# Altium footprint library Connectors.PcbLib: 36 footprints (part 2 of 3)
Each footprint in its own frame and in the unit in brackets; x right, y up, seen from the top. Pads: shape width x height; smd on the part's side, far side on the other; paste and mask are expansions set on the pad; w line width, h text height; cw(c..) or ccw(c..) is an arc to the next point about the centre after c.
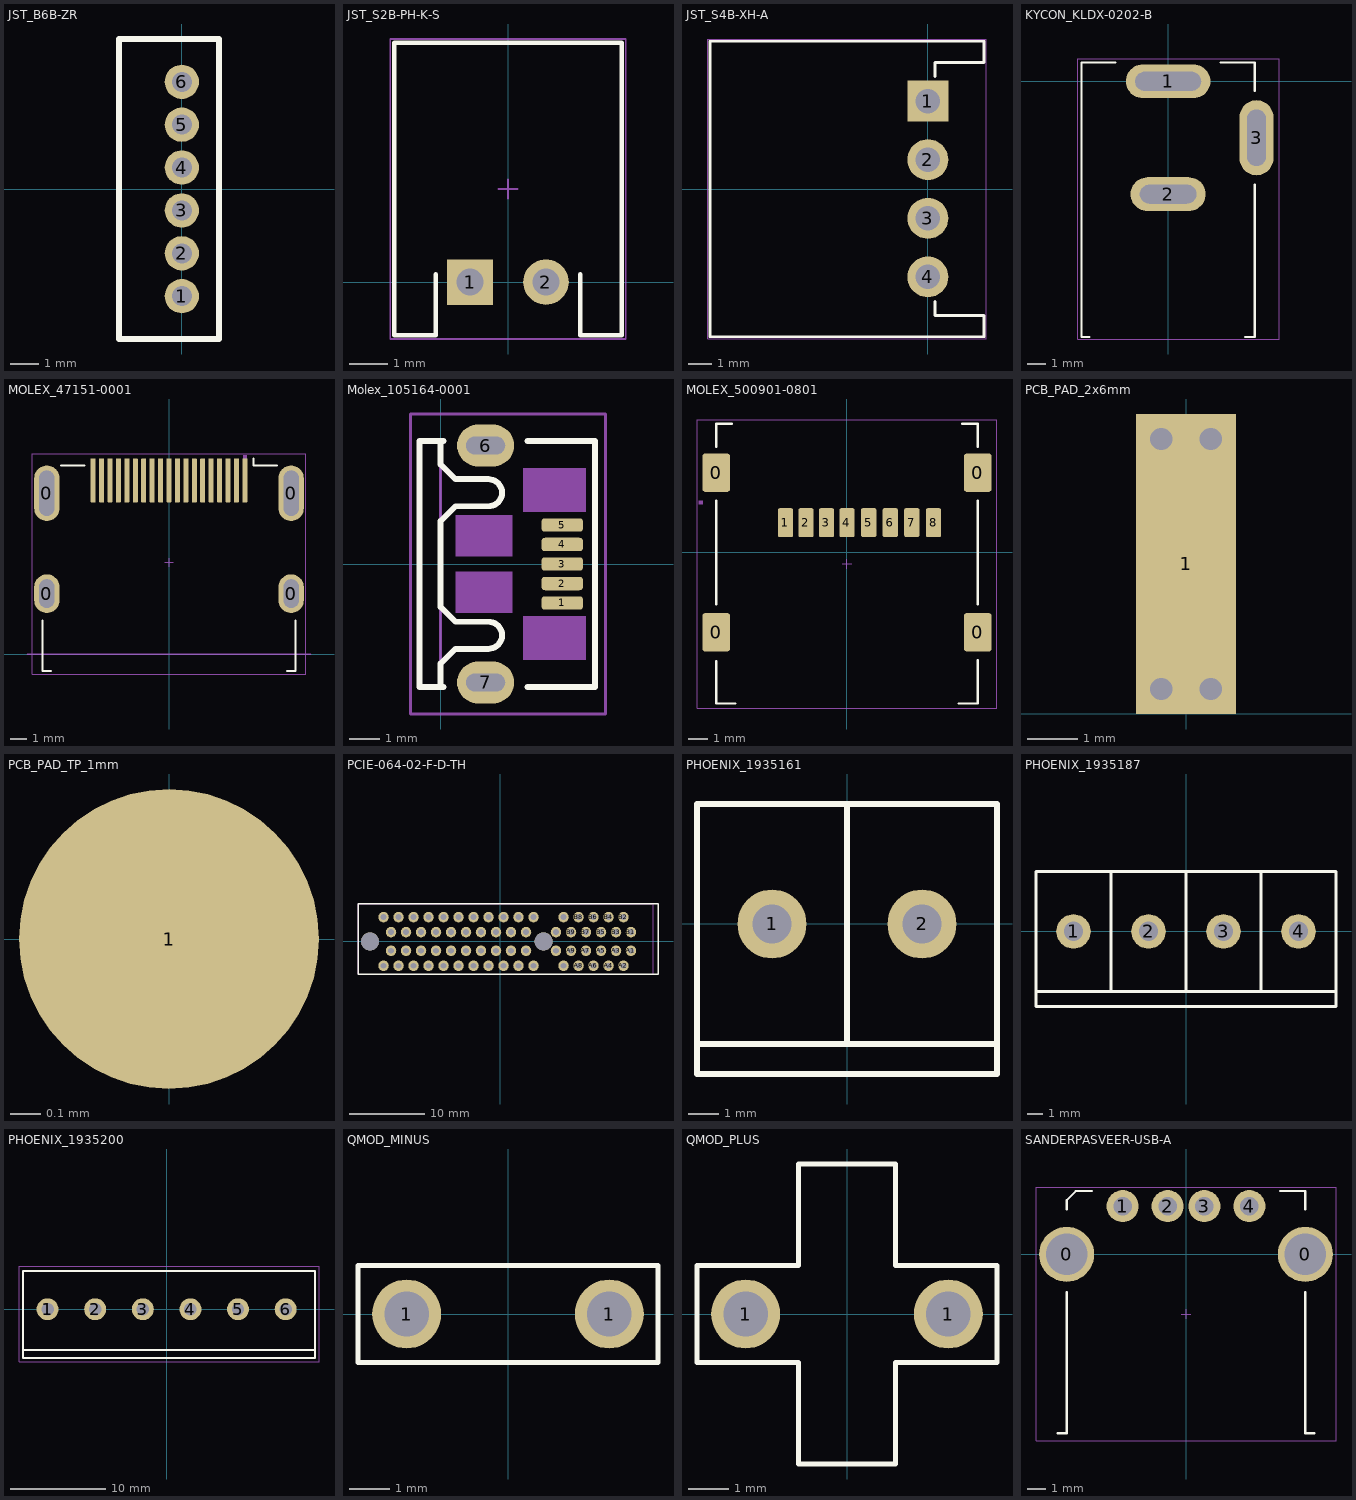
[diagram p1: the footprints below, top view; thin cyan lines are the x and y axes]

## JST_B6B-ZR [mm] "1.5mm pitch/Disconnectable Crimp style connector"
height 4.5
pads (6):
  round 1.2 hole 0.7: 1(0,-3.75) 2(0,-2.25) 3(0,-0.75) 4(0,0.75) 5(0,2.25) 6(0,3.75)
Top Overlay:
  lines w0.2: -2.2,-5.25 -2.2,5.25 1.3,5.25 1.3,-5.25 -2.2,-5.25
15. Courtyard TOP:
  lines w0.1: -2.2,-5.25 1.3,-5.25 1.3,5.25 -2.2,5.25 -2.2,-5.25
  text "." at 0.7,-4.85 h1
  text ".designator" at 0.5,-2.75 h1.5

## JST_S2B-PH-K-S [mm]
height 4.8
pads (2):
  rect 1.2x1.2 hole 0.7: 1(-1,0)
  round 1.2 hole 0.7: 2(1,0)
Top Overlay:
  lines w0.12: -1.9,0.2 -1.9,-1.4 -3,-1.4 -3,6.3 3,6.3 3,-1.4 1.9,-1.4 1.9,0.2
15. Courtyard TOP:
  lines w0.05: -0.25,2.45 0.25,2.45 ; 0,2.2 0,2.7 ; -3.1,-1.5 -3.1,6.4 3.1,6.4 3.1,-1.5 -3.1,-1.5
18. Assembly TOP:
  lines w0.05: -3.1,-1.5 3.1,-1.5 3.1,6.4 -3.1,6.4 -3.1,-1.5
  text ".designator" at 0.6,-0.3 h1.5
3D body: height 4.81, standoff -3.39, extent -2.95,-1.35 2.95,6.25

## JST_S4B-XH-A [mm]
height 6
pads (4):
  rect 1.75x1.75 hole 1.05: 1(0,3.75)
  round 1.75 hole 1.05: 2(0,1.25) 3(0,-1.25) 4(0,-3.75)
Top Overlay:
  lines w0.12: 0.3,-4.8 0.3,-5.4 2.4,-5.4 2.4,-6.3 -9.3,-6.3 -9.3,6.3 2.4,6.3 2.4,5.4 0.3,5.4 0.3,4.8
15. Courtyard TOP:
  lines w0.05: -9.4,-6.4 2.5,-6.4 2.5,6.4 -9.4,6.4 -9.4,-6.4
  text ".designator" at -8.3,-0.6 h1.5
3D body: height 6.11, standoff -3.39, extent -9.2,-6.2 2.3,6.2

## KYCON_KLDX-0202-B [mm] "Kycon DC Power Connectors 2.5mm PCB"
height 11
pads (3):
  oval 4.5x1.8 hole 1 slot 3.5 at 0 deg: 1(0,0)
  oval 4x1.8 hole 1 slot 3 at 0 deg: 2(0,-6)
  oval 1.8x4 hole 1 slot 3 at 90 deg: 3(4.7,-3)
Top Overlay:
  lines w0.12: -4.2,-13.6 -4.6,-13.6 -4.6,1 -2.794,1 ; 2.794,1 4.6,1 4.6,-0.508 ; 4.1,-13.6 4.6,-13.6 4.6,-5.5
15. Courtyard TOP:
  lines w0.05: 0.3,-6.25 0.8,-6.25 ; 0.55,-6.5 0.55,-6 ; -4.8,-13.7 5.9,-13.7 5.9,1.2 -4.8,1.2 -4.8,-13.7
18. Assembly TOP:
  lines w0.05: -4.8,-13.7 5.9,-13.7 5.9,1.2 -4.8,1.2 -4.8,-13.7
  text ".designator" at -2.6,-6.8 h1.5
3D body: height 11.18, standoff -3.6, extent -4.572,-13.539 4.9,0.939

## MOLEX_47151-0001 [mm] "Molex HDMI right angle header assembly"
height 6.2
pads (23):
  oval 1.5x2.3 hole 0.9 slot 1.7 at 90 deg mask+0.07: 0(-7.25,3.59) 0(7.25,3.59)
  oval 1.5x3.3 hole 0.9 slot 2.7 at 90 deg mask+0.07: 0(-7.25,9.55) 0(7.25,9.55)
  rrect23% 0.3x2.6 smd: 1(4.5,10.31) 2(4,10.31) 3(3.5,10.31) 4(3,10.31) 5(2.5,10.31) 6(2,10.31) 7(1.5,10.31) 8(1,10.31) 9(0.5,10.31) 10(0,10.31) 11(-0.5,10.31) 12(-1,10.31) 13(-1.5,10.31) 14(-2,10.31) 15(-2.5,10.31) 16(-3,10.31) 17(-3.5,10.31) 18(-4,10.31) 19(-4.5,10.31)
Top Overlay:
  lines w0.12: -7.5,2 -7.5,-1 -7,-1 ; -6.4,11.2 -5,11.2 ; 5,11.6 5,11.2 6.4,11.2 ; 7,-1 7.5,-1 7.5,2
15. Courtyard TOP:
  lines w0.05: -0.25,5.45 0.25,5.45 ; 0,5.2 0,5.7 ; -8.1,-1.2 -8.1,11.9 8.1,11.9 8.1,-1.2 -8.1,-1.2
18. Assembly TOP:
  region: 4.4,11.8 4.6,11.8 4.6,11.6 4.4,11.6
  lines w0.05: -8.1,-1.2 8.1,-1.2 8.1,11.9 -8.1,11.9 -8.1,-1.2
  text ".designator" at -2.7,4.7 h1.5
20. Alignments:
  lines w0.1: -8.4,0 8.4,0 ; 8.4,0 8.4,0
3D body: height 6.18, standoff -2.17, extent -7.5,-0.95 7.5,11.21

## Molex_105164-0001 [mm] "Micro USB connector"
height 2.7
pads (7):
  rrect50% 1.38x0.45 smd: 1(4.058,-1.3) 2(4.058,-0.65) 3(4.058,0) 4(4.058,0.65) 5(4.058,1.3)
  oval 1.9x1.4 hole 0.6 slot 1.3 at 0 deg: 6(1.502,3.95) 7(1.502,-3.95)
Top Overlay:
  lines w0.2: 0,-4.1 0,-3.325 0.5,-2.825 1.6,-2.825 ccw(c1.6,-2.375) 2.05,-2.375 ccw(c1.6,-2.375) 1.6,-1.925 0.5,-1.925 0,-1.425 0,1.425 0.5,1.925 1.6,1.925 ccw(c1.6,2.375) 2.05,2.375 ccw(c1.6,2.375) 1.6,2.825 0.5,2.825 0,3.325 0,4.1 ; 0.1,-4.1 -0.7,-4.1 -0.7,4.1 0.1,4.1 ; 2.9,-4.1 5.142,-4.1 5.142,4.1 2.9,4.1
15. Courtyard TOP:
  lines w0.1: -1,-5 5.5,-5 5.5,5 -1,5 -1,-5
  text "." at 4,-1.4 h1
  text ".designator" at 0.8,-0.5 h1
20. Alignments:
  lines w0.1: 0,-4.1 0,4.1
21. Comp.notes:
  rectangle: 0.5,-1.625 2.4,-0.25
  rectangle: 0.5,0.25 2.4,1.625
  rectangle: 2.75,-3.2 4.85,-1.725
  rectangle: 2.75,1.725 4.85,3.2
  text "note: 3D Model incomplete" at 0,-0.1 h0.2
3D body: height 2.72, standoff -0.58, extent -0.73,-4.1 4.7,4.1

## MOLEX_500901-0801 [mm] "MicroSD hinged memory card connector"
height 2
pads (12):
  rrect23% 1.45x2 smd: 0(-6.8,-4.15) 0(-6.8,4.15) 0(6.8,-4.15) 0(6.8,4.15)
  rrect23% 0.8x1.5 smd: 1(-3.2,1.55) 2(-2.133,1.55) 3(-1.067,1.55) 4(0,1.55) 5(1.125,1.55) 6(2.25,1.55) 7(3.375,1.55) 8(4.5,1.55)
Top Overlay:
  lines w0.12: -6.8,-5.65 -6.8,-7.85 -5.8,-7.85 ; -6.8,-2.7 -6.8,2.7 ; -6.8,5.5 -6.8,6.7 -6,6.7 ; 5.8,-7.85 6.8,-7.85 6.8,-5.6 ; 6,6.7 6.8,6.7 6.8,5.5 ; 6.8,-2.7 6.8,2.7
15. Courtyard TOP:
  lines w0.05: -0.25,-0.6 0.25,-0.6 ; 0,-0.85 0,-0.35 ; -7.8,-8.1 -7.8,6.9 7.8,6.9 7.8,-8.1 -7.8,-8.1
18. Assembly TOP:
  region: -7.7,2.7 -7.5,2.7 -7.5,2.5 -7.7,2.5
  lines w0.05: -7.8,-8.1 7.8,-8.1 7.8,6.9 -7.8,6.9 -7.8,-8.1
  text ".designator" at -2.7,-1.3 h1.5
3D body: height 1.93, standoff -0.02, extent -7.3,-7.8 7.3,6.7

## PCB_PAD_2x6mm [mm] "SMD Solder pad 2mm X 6mm"
pads (1):
  rect 2x6 smd paste+0 mask+0: 1(0,3)
via 0.5,0.5 diameter 0.95 hole 0.45
via -0.5,0.5 diameter 0.95 hole 0.45
via 0.5,5.5 diameter 0.95 hole 0.45
via -0.5,5.5 diameter 0.95 hole 0.45

## PCB_PAD_TP_1mm [mm] "SMD Testpoint 1mm diameter"
pads (1):
  round 1 smd paste+0 mask+0: 1(0,0)

## PCIE-064-02-F-D-TH [mm] "PCIe X4 connector"
height 10
pads (66):
  round 1.4 hole 0.78: A1(17.4,-1.25) A2(16.4,-3.25) A3(15.4,-1.25) A4(14.4,-3.25) A5(13.4,-1.25) A6(12.4,-3.25) A7(11.4,-1.25) A8(10.4,-3.25) A9(9.4,-1.25) A10(8.4,-3.25) A11(7.4,-1.25) A12(4.4,-3.25) A13(3.4,-1.25) A14(2.4,-3.25) A15(1.4,-1.25) A16(0.4,-3.25) A17(-0.6,-1.25) A18(-1.6,-3.25) A19(-2.6,-1.25) A20(-3.6,-3.25) A21(-4.6,-1.25) A22(-5.6,-3.25) A23(-6.6,-1.25) A24(-7.6,-3.25) A25(-8.6,-1.25) A26(-9.6,-3.25) A27(-10.6,-1.25) A28(-11.6,-3.25) A29(-12.6,-1.25) A30(-13.6,-3.25) A31(-14.6,-1.25) A32(-15.6,-3.25) B1(17.4,1.25) B2(16.4,3.25) B3(15.4,1.25) B4(14.4,3.25) B5(13.4,1.25) B6(12.4,3.25) B7(11.4,1.25) B8(10.4,3.25) B9(9.4,1.25) B10(8.4,3.25) B11(7.4,1.25) B12(4.4,3.25) B13(3.4,1.25) B14(2.4,3.25) B15(1.4,1.25) B16(0.4,3.25) B17(-0.6,1.25) B18(-1.6,3.25) B19(-2.6,1.25) B20(-3.6,3.25) B21(-4.6,1.25) B22(-5.6,3.25) B23(-6.6,1.25) B24(-7.6,3.25) B25(-8.6,1.25) B26(-9.6,3.25) B27(-10.6,1.25) B28(-11.6,3.25) B29(-12.6,1.25) B30(-13.6,3.25) B31(-14.6,1.25) B32(-15.6,3.25)
  round 2.4 hole 2.4 unplated: ""(-17.4,0) ""(5.75,0)
Top Overlay:
  lines w0.2: -19,-4.35 21,-4.35 21,5 -19,5 -19,-4.35
15. Courtyard TOP:
  lines w0.1: -19,-4.35 20.345,-4.35 20.345,5 -19,5 -19,-4.35
  text ".designator" at -1.6,-1.25 h2
3D body: height 11.02, standoff -4.39, extent -18.644,-3.721 20.345,4.889

## PHOENIX_1935161 [mm]
pads (2):
  round 2.3 hole 1.3 unplated paste+0 mask+0: 1(-2.5,0) 2(2.5,0)
Top Overlay:
  lines w0.2: 0,-4 0,4 ; -5,-4 5,-4 ; -5,-4 -5,4 5,4 5,-4 ; -5,-4 -5,-5 5,-5 5,-4
15. Courtyard TOP:
  lines w0.1: -5,-5 -5,4 5,4 5,-5 -5,-5
  text ".designator" at -1.5,-1 h1
3D body: height 10.02, standoff -3.48, extent -5.6,-4.075 4.97,4.075

## PHOENIX_1935187 [mm]
pads (4):
  round 2.3 hole 1.3 unplated paste+0 mask+0: 1(-7.5,0) 2(-2.5,0) 3(2.5,0) 4(7.5,0)
Top Overlay:
  lines w0.2: -5,-4 -5,4 ; 0,-4 0,4 ; 5,-4 5,4 ; -10,-4 -10,-5 10,-5 10,-4 ; -10,-4 -10,4 10,4 10,-4 ; -10,-4 10,-4
15. Courtyard TOP:
  lines w0.1: -10,-5 10,-5 10,4 -10,4 -10,-5
  text ".designator" at -4.5,-1 h1
3D body: height 10, standoff -3.5, extent -10.57,-4.075 10,4.075

## PHOENIX_1935200 [mm] "Fixed Terminal Blocks PT 1.5/6-5.0-H"
pads (6):
  round 2.3 hole 1.3 paste+0 mask+0: 1(-12.5,0) 2(-7.5,0) 3(-2.5,0) 4(2.5,0) 5(7.5,0) 6(12.5,0)
Top Overlay:
  lines w0.2: 15.6,-4.3 -15.1,-4.3 ; -15.1,-4.3 -15.1,-5.1 15.6,-5.1 15.6,-3.4 15.6,4 -15.1,4 -15.1,-4.3
15. Courtyard TOP:
  lines w0.1: -15.5,-5.5 16,-5.5 16,4.5 -15.5,4.5 -15.5,-5.5
  text ".designator" at -1.5,-0.5 h1
3D body: height 11.42, standoff -3.48, extent -15,-5 15.57,4

## QMOD_MINUS [mm]
pads (2):
  round 1.7 hole 1.1: 1(-2.5,0) 1(2.5,0)
Top Overlay:
  lines w0.12: -3.7,-1.2 3.7,-1.2 3.7,1.2 -3.7,1.2 -3.7,-1.2

## QMOD_PLUS [mm]
pads (2):
  round 1.7 hole 1.1: 1(-2.5,0) 1(2.5,0)
Top Overlay:
  lines w0.12: -3.7,-1.2 -1.2,-1.2 -1.2,-3.7 1.2,-3.7 1.2,-1.2 3.7,-1.2 3.7,1.2 1.2,1.2 1.2,3.7 -1.2,3.7 -1.2,1.2 -3.7,1.2 -3.7,-1.2

## SANDERPASVEER-USB-A [mil]
pads (6):
  round 120 hole 90: 0(-260,0) 0(260,0)
  round 70 hole 40: 1(-138,105) 2(-40,105) 3(40,105) 4(138,105)
Top Overlay:
  lines w4.72: -279.53,-389.76 -259.84,-389.76 -259.84,-82.68 ; -259.84,98.43 -259.84,118.11 -240.16,137.8 -204.72,137.8 ; 204.72,137.8 259.84,137.8 259.84,98.43 ; 259.84,-82.68 259.84,-389.76 279.53,-389.76
15. Courtyard TOP:
  lines w1.97: -9.84,-129.92 9.84,-129.92 ; 0,-139.76 0,-120.08 ; -326.77,-405.51 326.77,-405.51 326.77,145.67 -326.77,145.67 -326.77,-405.51
18. Assembly TOP:
  lines w1.97: -326.77,-405.51 -326.77,145.67 326.77,145.67 326.77,-405.51 -326.77,-405.51
  text ".designator" at -105.31,-157.48 h59.06
3D body: height 274.22, standoff -164.75, extent -311.03,-401.57 311.02,137.8